# Altium footprint library self_pcblib.PcbLib: 94 footprints (part 6 of 6)
Each footprint in its own frame and in the unit in brackets; x right, y up, seen from the top. Pads: shape width x height; smd on the part's side, far side on the other; paste and mask are expansions set on the pad; w line width, h text height; cw(c..) or ccw(c..) is an arc to the next point about the centre after c.
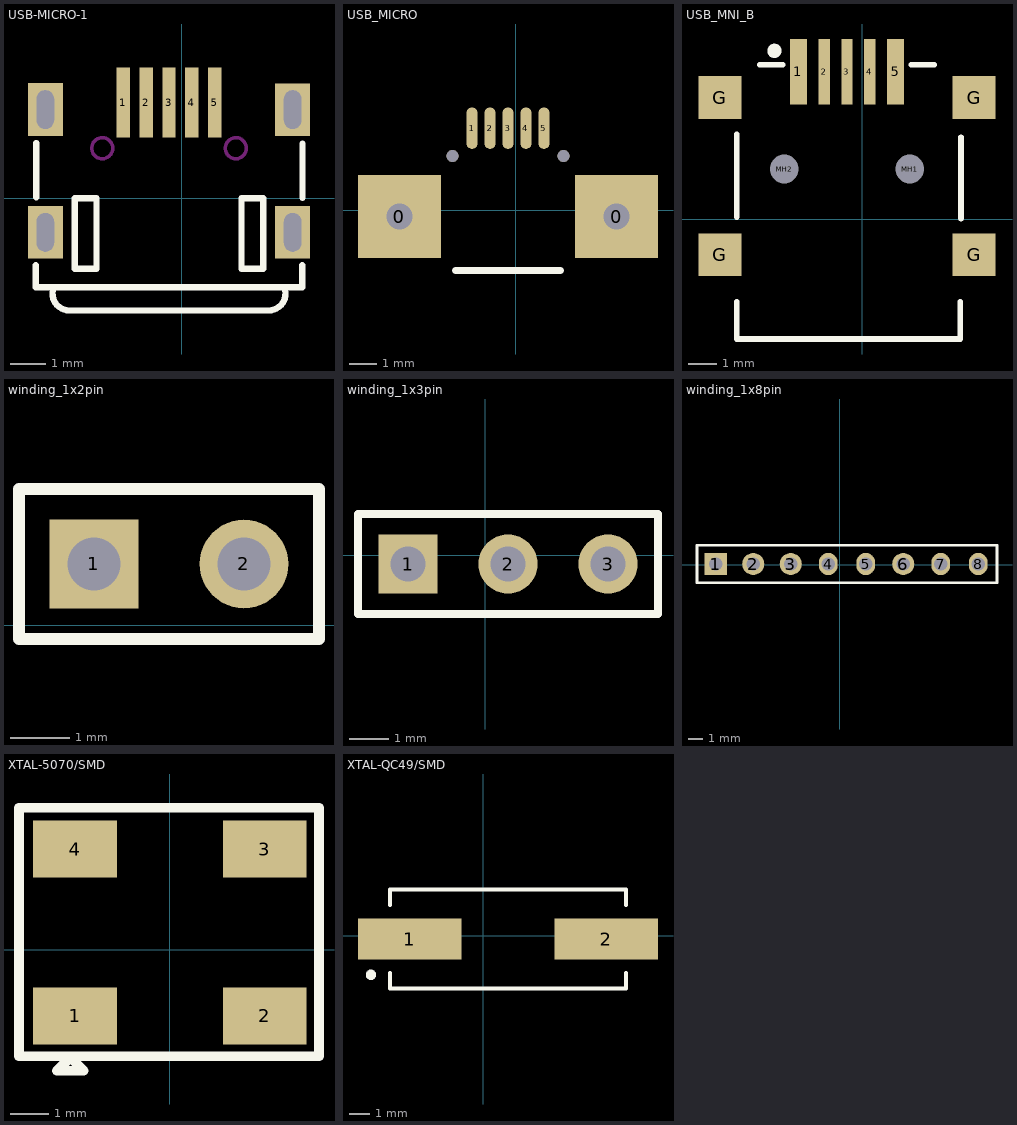
[diagram p5: the footprints below, top view; thin cyan lines are the x and y axes]

## USB-MICRO-1 [mm]
pads (9):
  rect 0.381x2 smd: 1(-1.661,2.733) 2(-1.011,2.733) 3(-0.361,2.733) 4(0.289,2.733) 5(0.939,2.733)
  rect 1x1.5 hole 0.5 slot 1.1 at 90 deg: ""(-3.888,-0.965) ""(-3.888,2.535) ""(3.166,-0.965) ""(3.166,2.533)
Top Overlay:
  lines w0.178: -4.145,0.035 -4.145,1.584 ; -3.67,-2.614 ccw(c-3.203,-2.716) -3.203,-3.194 ; -3.228,-3.194 2.464,-3.194 ; 2.481,-3.194 ccw(c2.481,-2.716) 2.948,-2.614 ; 3.439,-1.905 3.439,-2.531 -4.161,-2.531 ; 3.449,0.009 3.449,1.559 ; -4.161,-2.531 -4.161,-1.905 -4.161,-2.531 ; -3.046,-2.005 -2.426,-2.005 -2.426,0.005 -3.046,0.005 -3.046,-2.005 ; 1.704,-2.005 2.324,-2.005 2.324,0.005 1.704,0.005 1.704,-2.005
Keep-Out Layer:
  circle w0.1: c1.544,1.432 r0.3
  circle w0.1: c-2.266,1.432 r0.3
3D body: height 2.77, standoff -0.17, extent -4.445,-3.408 3.755,2.522

## USB_MICRO [mm]
pads (7):
  rect 3x3 / inner rect 3x3 / far side round 1.524 hole 0.94: 0(-4.207,-0.239) 0(3.643,-0.239)
  oval 0.4x1.5 smd: 1(-1.582,2.961) 2(-0.932,2.961) 3(-0.282,2.961) 4(0.368,2.961) 5(1.018,2.961)
via 1.718,1.953 diameter 0.432 hole 0.432
via -2.282,1.953 diameter 0.432 hole 0.432
Top Overlay:
  lines w0.254: -2.187,-2.189 1.623,-2.189
3D body: height 2.64, standoff -0.66, extent -4.371,-2.087 3.829,3.343

## USB_MNI_B [mm]
pads (11):
  rect 0.6x2.3 smd: 1(-2.226,5.164) 5(1.174,5.164)
  rect 0.4x2.3 smd: 2(-1.326,5.164) 3(-0.526,5.164) 4(0.274,5.164)
  rect 1.5x1.5 smd: G(-4.976,-1.236) G(-4.976,4.264) G(3.924,-1.236) G(3.924,4.264)
  round 0.6 hole 1 unplated: MH1(1.674,1.764) MH2(-2.726,1.764)
Top Overlay:
  circle w0.25: c-3.066,5.899 r0.125
  lines w0.2: -4.387,-2.886 -4.387,-4.186 3.436,-4.186 3.436,-2.886 ; -4.387,0.084 -4.387,2.98 ; -3.576,5.414 -2.776,5.414 ; 1.724,5.414 2.524,5.414 ; 3.462,0.034 3.462,2.878
Mechanical 13:
  lines w0.1: -4.387,-4.183 3.462,-4.183
3D body: height 3.95, standoff -1, extent -5.876,-4.094 4.824,5.106

## winding_1x2pin [mm]
pads (2):
  rect 1.5x1.5 hole 0.9: 1(-5.105,1.041)
  round 1.5 hole 0.9: 2(-2.565,1.041)
Top Overlay:
  lines w0.2: -6.375,-0.229 -6.375,2.311 -1.295,2.311 -1.295,-0.229 -6.375,-0.229
3D body: height 1.27, standoff -4.27, extent -6.35,-8.939 -1.27,1.421

## winding_1x3pin [mm]
pads (3):
  rect 1.5x1.5 hole 0.9: 1(-1.956,-0.229)
  round 1.5 hole 0.9: 2(0.584,-0.229) 3(3.124,-0.229)
Top Overlay:
  lines w0.2: -3.226,-1.499 -3.226,1.041 4.394,1.041 4.394,-1.499 -3.226,-1.499
3D body: height 1.27, standoff -4.27, extent -3.226,-0.557 4.394,9.803

## winding_1x4pin [mm]

## winding_1x5pin [mm]

## winding_1x8pin [mm]
pads (8):
  rect 1.5x1.5 hole 0.9: 1(-8.382,0.051)
  round 1.5 hole 0.9: 2(-5.842,0.051) 3(-3.302,0.051) 6(4.318,0.051)
  oval 1.27x1.5 hole 0.9: 4(-0.762,0.051) 5(1.778,0.051) 7(6.858,0.051) 8(9.398,0.051)
Top Overlay:
  lines w0.2: -9.652,-1.219 -9.652,1.321 10.668,1.321 10.668,-1.219 -9.652,-1.219
3D body: height 1.27, standoff -4.27, extent -9.677,-0.278 10.643,10.082

## winding_2x2pin [mm]

## winding_2x3pin [mm]

## winding_2x4pin [mm]

## winding_2x5pin [mm]

## XTAL-5070/SMD [mm]
pads (4):
  rect 2.2x1.5 smd: 1(-2.484,-1.741) 2(2.496,-1.741) 3(2.496,2.639) 4(-2.484,2.639)
Top Overlay:
  lines w0.254: -3.956,-2.802 3.918,-2.802 3.918,3.726 -3.956,3.726 -3.956,-2.802 ; -2.966,-3.183 -2.61,-2.828 -2.255,-3.183 -2.966,-3.183
3D body: height 1, standoff -0.01, extent -3.644,-1.989 3.656,2.811

## XTAL-QC49/SMD [mm]
pads (2):
  rect 5x2 smd: 1(-3.556,-0.152) 2(5.944,-0.152)
Top Overlay:
  circle w0.25: c-5.431,-1.882 r0.125
  lines w0.2: -4.506,-1.802 -4.506,-2.552 6.894,-2.552 6.894,-1.802 ; -4.506,1.498 -4.506,2.248 6.894,2.248 6.894,1.498
3D body: height 4.31, standoff 0, extent -4.88,-2.544 7.42,2.286